# Altium footprint library IC.PcbLib: 163 footprints (part 6 of 11)
Each footprint in its own frame and in the unit in brackets; x right, y up, seen from the top. Pads: shape width x height; smd on the part's side, far side on the other; paste and mask are expansions set on the pad; w line width, h text height; cw(c..) or ccw(c..) is an arc to the next point about the centre after c.
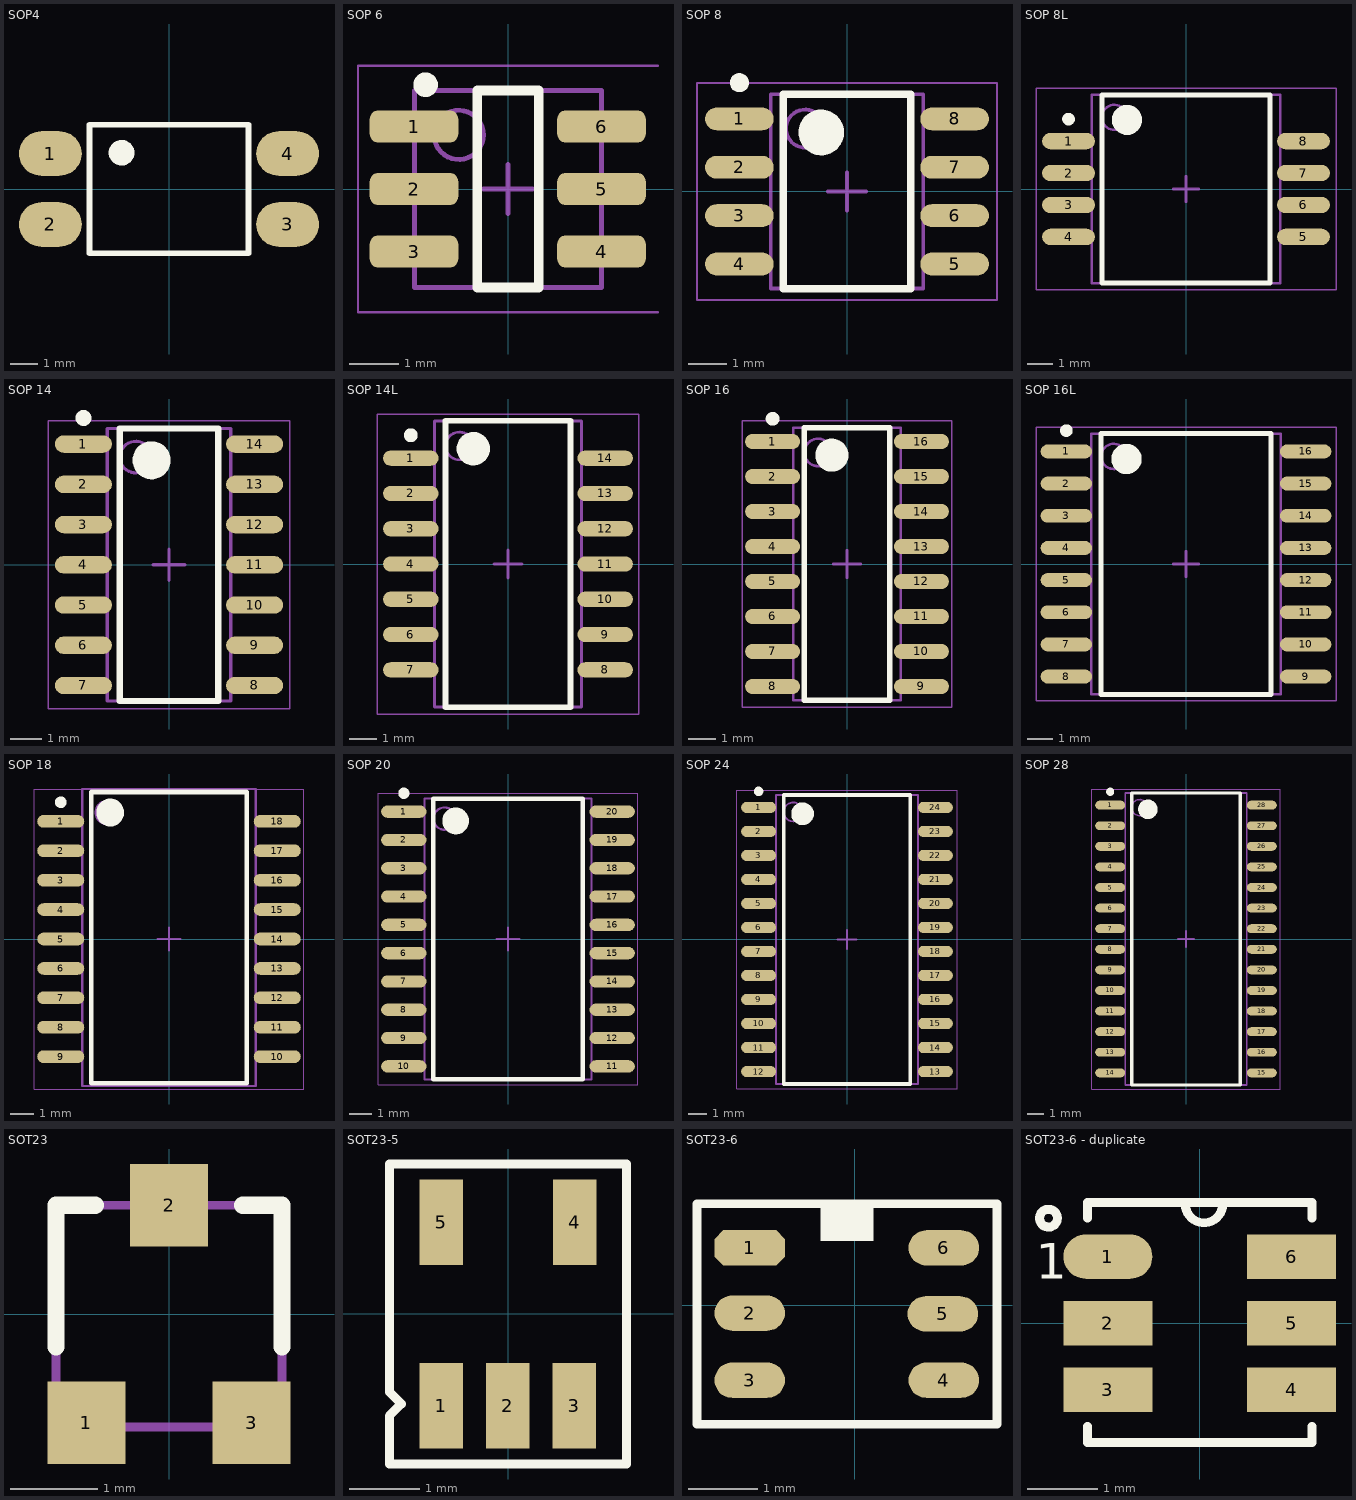
[diagram p5: the footprints below, top view; thin cyan lines are the x and y axes]

## SOP4 [mm]
pads (4):
  oval 2.25x1.6 smd: 1(-4.25,1.27) 2(-4.25,-1.27) 3(4.25,-1.27) 4(4.25,1.27)
Top Overlay:
  circle w0.2: c-1.7,1.3 r0.361
  region: -1.4,1.003 -2.006,1.003 -2.006,1.6 -1.4,1.6
  lines w0.2: -2.85,-2.3 2.85,-2.3 2.85,2.3 -2.85,2.3 -2.85,-2.3
3D body "pc817x1nip1b.stp": height 3.6, standoff 0, extent -4.673,-2.286 4.927,2.314

## SOP 6 [mm] "SOP6"
height 1.1
pads (6):
  rrect50% 1.8x0.65 smd: 1(-1.91,1.27) 2(-1.91,0) 3(-1.91,-1.27) 4(1.9,-1.27) 5(1.9,0) 6(1.9,1.27)
Top Overlay:
  circle w0.25: c-1.675,2.12 r0.125
  lines w0.2: -0.625,-2 0.625,-2 0.625,2 -0.625,2 -0.625,-2
Mechanical 13:
  circle w0.1: c-1,1.1 r0.5
  lines w0.1: -1.9,-2 1.9,-2 1.9,2 -1.9,2 -1.9,-2
Mechanical 15:
  lines w0.05: 3.048,-2.5 -3.048,-2.5 -3.048,2.5 3.048,2.5
  lines w0.1: -0.5,0 0.5,0 ; 0,-0.5 0,0.5
3D body "SOIC127P490X150-6N.step": height 1.5, standoff 0, extent -2.45,-2 2.45,2

## SOP 8 [mm] "SOIC, 8-Leads, Body 4.9x3.9mm, Pitch 1.27mm, IPC High Density"
pads (8):
  oval 1.8x0.6 smd: 1(-2.825,1.905) 2(-2.825,0.635) 3(-2.825,-0.635) 4(-2.825,-1.905) 5(2.825,-1.905) 6(2.825,-0.635) 7(2.825,0.635) 8(2.825,1.905)
Top Overlay:
  circle w0.6: c-0.675,1.55 r0.3
  circle w0.25: c-2.825,2.855 r0.125
  lines w0.2: -1.675,-2.55 1.675,-2.55 1.675,2.55 -1.675,2.55 -1.675,-2.55
Mechanical 13:
  circle w0.1: c-1.1,1.65 r0.5
  lines w0.1: -2,-2.55 2,-2.55 2,2.55 -2,2.55 -2,-2.55
Mechanical 15:
  lines w0.05: -3.937,-2.85 3.937,-2.85 3.937,2.85 -3.937,2.85 -3.937,-2.85
  lines w0.1: -0.5,0 0.5,0 ; 0,-0.5 0,0.5
3D body "CircuitWorks-SO-8 (PIC12FXXX).step": height 1.6, standoff 0, extent -2.995,-2.45 2.995,2.45

## SOP 8L [mm] "SOIC, 8-Leads, Body 7.50x7.50mm, Pitch 1.27mm, IPC Medium Density"
height 1.5
pads (8):
  oval 2.1x0.65 smd: 1(-4.675,1.905) 2(-4.675,0.635) 3(-4.675,-0.635) 4(-4.675,-1.905) 5(4.675,-1.905) 6(4.675,-0.635) 7(4.675,0.635) 8(4.675,1.905)
Top Overlay:
  circle w0.25: c-4.675,2.78 r0.125
  circle w0.6: c-2.35,2.75 r0.3
  lines w0.2: -3.35,-3.75 -3.35,3.75 3.35,3.75 3.35,-3.75 -3.35,-3.75
Mechanical 13:
  circle w0.1: c-2.85,2.85 r0.5
  lines w0.1: -3.75,-3.75 -3.75,3.75 3.75,3.75 3.75,-3.75 -3.75,-3.75
Mechanical 15:
  lines w0.05: -5.969,-4 -5.969,4 5.969,4 5.969,-4 -5.969,-4
  lines w0.1: -0.5,0 0.5,0 ; 0,-0.5 0,0.5
3D body "SOIC127P1000X150-8N.step": height 1.5, standoff 0, extent -5,-3.65 5,3.65

## SOP 14 [mm] "SOIC, 14-Leads, Body 8.60x3.90mm, Pitch 1.27mm, IPC Medium Density"
height 1.75
pads (14):
  oval 1.8x0.55 smd: 1(-2.7,3.81) 2(-2.7,2.54) 3(-2.7,1.27) 4(-2.7,0) 5(-2.7,-1.27) 6(-2.7,-2.54) 7(-2.7,-3.81) 8(2.7,-3.81) 9(2.7,-2.54) 10(2.7,-1.27) 11(2.7,0) 12(2.7,1.27) 13(2.7,2.54) 14(2.7,3.81)
Top Overlay:
  circle w0.6: c-0.55,3.3 r0.3
  circle w0.25: c-2.7,4.635 r0.125
  lines w0.2: -1.55,-4.3 1.55,-4.3 1.55,4.3 -1.55,4.3 -1.55,-4.3
Mechanical 13:
  circle w0.1: c-1.05,3.4 r0.5
  lines w0.1: -1.95,-4.3 1.95,-4.3 1.95,4.3 -1.95,4.3 -1.95,-4.3
Mechanical 15:
  lines w0.05: -3.81,-4.55 3.81,-4.55 3.81,4.55 -3.81,4.55 -3.81,-4.55
  lines w0.1: -0.5,0 0.5,0 ; 0,-0.5 0,0.5
3D body "SOIC127P600X175-14N.step": height 1.75, standoff 0, extent -2.873,-4.3 3.127,4.3

## SOP 14L [mm] "SOIC, 14-Leads, Body 10.30x5.30mm, Pitch 1.27mm, IPC Medium Density"
height 2
pads (14):
  oval 2x0.55 smd: 1(-3.5,3.81) 2(-3.5,2.54) 3(-3.5,1.27) 4(-3.5,0) 5(-3.5,-1.27) 6(-3.5,-2.54) 7(-3.5,-3.81) 8(3.5,-3.81) 9(3.5,-2.54) 10(3.5,-1.27) 11(3.5,0) 12(3.5,1.27) 13(3.5,2.54) 14(3.5,3.81)
Top Overlay:
  circle w0.25: c-3.5,4.635 r0.125
  circle w0.6: c-1.25,4.15 r0.3
  lines w0.2: -2.25,-5.15 -2.25,5.15 2.25,5.15 2.25,-5.15 -2.25,-5.15
Mechanical 13:
  circle w0.1: c-1.75,4.25 r0.5
  lines w0.1: -2.65,-5.15 -2.65,5.15 2.65,5.15 2.65,-5.15 -2.65,-5.15
Mechanical 15:
  lines w0.05: -4.699,-5.4 -4.699,5.4 4.699,5.4 4.699,-5.4 -4.699,-5.4
  lines w0.1: -0.5,0 0.5,0 ; 0,-0.5 0,0.5
3D body "SOIC127P760X150-14N.step": height 1.5, standoff 0, extent -3.81,-5.15 3.81,5.15

## SOP 16 [mm] "SOIC, 16-Leads, Body 9.90x3.91mm, Pitch 1.27mm, IPC Medium Density"
height 1.75
pads (16):
  oval 2x0.55 smd: 1(-2.7,4.445) 2(-2.7,3.175) 3(-2.7,1.905) 4(-2.7,0.635) 5(-2.7,-0.635) 6(-2.7,-1.905) 7(-2.7,-3.175) 8(-2.7,-4.445) 9(2.7,-4.445) 10(2.7,-3.175) 11(2.7,-1.905) 12(2.7,-0.635) 13(2.7,0.635) 14(2.7,1.905) 15(2.7,3.175) 16(2.7,4.445)
Top Overlay:
  circle w0.25: c-2.7,5.27 r0.125
  circle w0.6: c-0.55,3.95 r0.3
  lines w0.2: -1.55,-4.95 -1.55,4.95 1.55,4.95 1.55,-4.95 -1.55,-4.95
Mechanical 13:
  circle w0.1: c-1.05,4.05 r0.5
  lines w0.1: -1.95,-4.95 -1.95,4.95 1.95,4.95 1.95,-4.95 -1.95,-4.95
Mechanical 15:
  lines w0.05: -3.81,-5.2 -3.81,5.2 3.81,5.2 3.81,-5.2 -3.81,-5.2
  lines w0.1: -0.5,0 0.5,0 ; 0,-0.5 0,0.5
3D body "User Library-SOIC-16-1.step": height 1.4, standoff 0, extent -3,-4.95 3,4.95

## SOP 16L [mm] "SOIC, 16-Leads, Body 10.30x7.50mm, Pitch 1.27mm, IPC Medium Density"
height 2.4
pads (16):
  oval 2.032x0.55 smd: 1(-4.725,4.445) 2(-4.725,3.175) 3(-4.725,1.905) 4(-4.725,0.635) 5(-4.725,-0.635) 6(-4.725,-1.905) 7(-4.725,-3.175) 8(-4.725,-4.445) 9(4.725,-4.445) 10(4.725,-3.175) 11(4.725,-1.905) 12(4.725,-0.635) 13(4.725,0.635) 14(4.725,1.905) 15(4.725,3.175) 16(4.725,4.445)
Top Overlay:
  circle w0.25: c-4.725,5.27 r0.125
  circle w0.6: c-2.35,4.15 r0.3
  lines w0.2: -3.35,-5.15 -3.35,5.15 3.35,5.15 3.35,-5.15 -3.35,-5.15
Mechanical 13:
  circle w0.1: c-2.85,4.25 r0.5
  lines w0.1: -3.75,-5.15 -3.75,5.15 3.75,5.15 3.75,-5.15 -3.75,-5.15
Mechanical 15:
  lines w0.05: -5.925,-5.4 -5.925,5.4 5.925,5.4 5.925,-5.4 -5.925,-5.4
  lines w0.1: -0.5,0 0.5,0 ; 0,-0.5 0,0.5
3D body "User Library-SO-16W.STEP": height 2.48, standoff 0, extent -5.155,-5.165 5.155,5.165

## SOP 18 [mm] "SOIC, 18-Leads, Body 11.50x7.50mm, Pitch 1.27mm, IPC Medium Density"
height 2.3
pads (18):
  oval 2.032x0.55 smd: 1(-4.675,5.08) 2(-4.675,3.81) 3(-4.675,2.54) 4(-4.675,1.27) 5(-4.675,0) 6(-4.675,-1.27) 7(-4.675,-2.54) 8(-4.675,-3.81) 9(-4.675,-5.08) 10(4.675,-5.08) 11(4.675,-3.81) 12(4.675,-2.54) 13(4.675,-1.27) 14(4.675,0) 15(4.675,1.27) 16(4.675,2.54) 17(4.675,3.81) 18(4.675,5.08)
Top Overlay:
  circle w0.25: c-4.675,5.905 r0.125
  circle w0.6: c-2.54,5.461 r0.3
  lines w0.2: -3.35,-6.223 -3.35,6.35 3.35,6.35 3.35,-6.223 -3.35,-6.223
Mechanical 13:
  circle w0.1: c-2.667,5.461 r0.5
  lines w0.1: -3.75,-6.35 -3.75,6.477 3.75,6.477 3.75,-6.35 -3.75,-6.35
Mechanical 15:
  lines w0.05: -5.825,-6.477 -5.825,6.477 5.825,6.477 5.825,-6.477 -5.825,-6.477
  lines w0.1: -0.5,0 0.5,0 ; 0,-0.5 0,0.5
3D body "User Library-SOIC18-300.step": height 2.7, standoff 0.05, extent -5.15,-5.765 5.15,5.765

## SOP 20 [mm] "SOIC, 20-Leads, Body 12.60x7.50mm, Pitch 1.27mm, IPC Medium Density"
height 2.65
pads (20):
  oval 2.032x0.55 smd: 1(-4.675,5.715) 2(-4.675,4.445) 3(-4.675,3.175) 4(-4.675,1.905) 5(-4.675,0.635) 6(-4.675,-0.635) 7(-4.675,-1.905) 8(-4.675,-3.175) 9(-4.675,-4.445) 10(-4.675,-5.715) 11(4.675,-5.715) 12(4.675,-4.445) 13(4.675,-3.175) 14(4.675,-1.905) 15(4.675,-0.635) 16(4.675,0.635) 17(4.675,1.905) 18(4.675,3.175) 19(4.675,4.445) 20(4.675,5.715)
Top Overlay:
  circle w0.6: c-2.35,5.3 r0.3
  circle w0.25: c-4.675,6.54 r0.125
  lines w0.2: -3.35,-6.3 3.35,-6.3 3.35,6.3 -3.35,6.3 -3.35,-6.3
Mechanical 13:
  circle w0.1: c-2.85,5.4 r0.5
  lines w0.1: -3.75,-6.3 3.75,-6.3 3.75,6.3 -3.75,6.3 -3.75,-6.3
Mechanical 15:
  lines w0.05: -5.825,-6.55 5.825,-6.55 5.825,6.55 -5.825,6.55 -5.825,-6.55
  lines w0.1: -0.5,0 0.5,0 ; 0,-0.5 0,0.5
3D body "User Library-SOIC20.step": height 2.25, standoff 0.01, extent -5.067,-6.3 5.067,6.3

## SOP 24 [mm] "SOIC, 24-Leads, Body 15.30x7.50mm, Pitch 1.27mm, IPC Medium Density"
height 2.3
pads (24):
  oval 1.85x0.6 smd: 1(-4.675,6.985) 2(-4.675,5.715) 3(-4.675,4.445) 4(-4.675,3.175) 5(-4.675,1.905) 6(-4.675,0.635) 7(-4.675,-0.635) 8(-4.675,-1.905) 9(-4.675,-3.175) 10(-4.675,-4.445) 11(-4.675,-5.715) 12(-4.675,-6.985) 13(4.675,-6.985) 14(4.675,-5.715) 15(4.675,-4.445) 16(4.675,-3.175) 17(4.675,-1.905) 18(4.675,-0.635) 19(4.675,0.635) 20(4.675,1.905) 21(4.675,3.175) 22(4.675,4.445) 23(4.675,5.715) 24(4.675,6.985)
Top Overlay:
  circle w0.25: c-4.675,7.835 r0.125
  circle w0.6: c-2.35,6.65 r0.3
  lines w0.2: -3.35,-7.65 -3.35,7.65 3.35,7.65 3.35,-7.65 -3.35,-7.65
Mechanical 13:
  circle w0.1: c-2.85,6.75 r0.5
  lines w0.1: -3.75,-7.65 -3.75,7.65 3.75,7.65 3.75,-7.65 -3.75,-7.65
Mechanical 15:
  lines w0.05: -5.825,-7.9 -5.825,7.9 5.825,7.9 5.825,-7.9 -5.825,-7.9
  lines w0.1: -0.5,0 0.5,0 ; 0,-0.5 0,0.5
3D body "User Library-SOIC_24.STEP": height 2.6, standoff 0, extent -5.2,-7.835 5.2,7.565

## SOP 28 [mm] "SOIC, 28-Leads, Body 18.00x7.50mm, Pitch 1.27mm, IPC Medium Density"
height 2.3
pads (28):
  oval 1.85x0.55 smd: 1(-4.675,8.255) 2(-4.675,6.985) 3(-4.675,5.715) 4(-4.675,4.445) 5(-4.675,3.175) 6(-4.675,1.905) 7(-4.675,0.635) 8(-4.675,-0.635) 9(-4.675,-1.905) 10(-4.675,-3.175) 11(-4.675,-4.445) 12(-4.675,-5.715) 13(-4.675,-6.985) 14(-4.675,-8.255) 15(4.675,-8.255) 16(4.675,-6.985) 17(4.675,-5.715) 18(4.675,-4.445) 19(4.675,-3.175) 20(4.675,-1.905) 21(4.675,-0.635) 22(4.675,0.635) 23(4.675,1.905) 24(4.675,3.175) 25(4.675,4.445) 26(4.675,5.715) 27(4.675,6.985) 28(4.675,8.255)
Top Overlay:
  circle w0.25: c-4.675,9.08 r0.125
  circle w0.6: c-2.35,8 r0.3
  lines w0.2: -3.35,-9 -3.35,9 3.35,9 3.35,-9 -3.35,-9
Mechanical 13:
  circle w0.1: c-2.85,8.1 r0.5
  lines w0.1: -3.75,-9 -3.75,9 3.75,9 3.75,-9 -3.75,-9
Mechanical 15:
  lines w0.05: -5.825,-9.25 -5.825,9.25 5.825,9.25 5.825,-9.25 -5.825,-9.25
  lines w0.1: -0.5,0 0.5,0 ; 0,-0.5 0,0.5
3D body "User Library-28-SOIC.step": height 2.73, standoff -0.03, extent -5.023,-9.01 5.277,8.89

## SOT23 [mm] "SOT23"
height 1.1
pads (3):
  rect 0.9x0.95 smd: 1(-0.95,-1.25) 2(0,1.25)
  rect 0.9x0.95 smd mask+0: 3(0.95,-1.25)
Top Overlay:
  lines w0.2: -1.3,-0.375 -1.3,1.25 -0.85,1.25 ; 0.85,1.25 1.3,1.25 1.3,-0.375
Mechanical 7:
  rectangle: -0.3,1.25 0.3,1.5
  region: -0.625,-1.275 -1.225,-1.275 -1.225,-1.525 -0.625,-1.525
  region: 1.225,-1.275 0.625,-1.275 0.625,-1.525 1.225,-1.525
  lines w0.1: -1.3,-1.3 -1.3,1.25 1.3,1.25 1.3,-1.3 -1.3,-1.3
  text ".Comment" at -1.2,0.325 h0.5
  text ".Designator" at -1.2,0.75 h0.5
3D body "SW3DPS-SOT-23-DEFAULT.STEP": height 1.06, standoff -0.04, extent -1.524,-1.23 1.476,1.27

## SOT23-5 [mm] "CASE: SOT"
height 1.1
pads (5):
  rect 0.62x1.22 smd mask+0.076: 1(-0.953,-1.31) 2(-0.003,-1.31) 3(0.947,-1.31) 4(0.952,1.31) 5(-0.953,1.31)
Top Overlay:
  lines w0.127: -1.689,-2.138 -1.689,-1.452 -1.519,-1.281 -1.689,-1.111 -1.689,2.137 1.689,2.137 1.689,-2.138 -1.689,-2.138
3D body "User Library-SOT-23-5.STEP": height 1.41, standoff -0.05, extent -1.5,-1.5 1.5,1.5

## SOT23-6 [mil]
pads (6):
  oct 40x20 smd: 1(-59.41,32.4)
  oval 40x20 smd: 2(-59.41,-4.6) 3(-59.41,-42.6) 4(50.59,-42.6) 5(50,-5) 6(50.59,32.4)
Top Overlay:
  rectangle: -19.41,36.34 10.59,56.02
  lines w5: -89.29,43.42 -89.29,44.42 ; -89.29,47.42 -89.29,57.42 ; -75.29,57.42 -73.29,57.42 ; -74.29,57.42 -89.29,57.42 ; -89.29,57.42 -89.29,-67.58 80.71,-67.58 80.71,57.42 -89.29,57.42
3D body "User Library-SOT23-6.step": height 51.18, standoff 0, extent -64.05,-64.05 54.06,54.06

## SOT23-6 - duplicate [mm] "CASE: SOT"
height 1.45
pads (6):
  oval 1.27x0.635 smd mask+0.076: 1(-1.31,0.95)
  rect 1.27x0.635 smd mask+0.076: 2(-1.31,0) 3(-1.31,-0.95) 4(1.31,-0.95) 5(1.31,0) 6(1.31,0.95)
Top Overlay:
  circle w0.127: c-2.159,1.499 r0.127
  lines w0.127: -1.6,-1.473 -1.6,-1.704 1.6,-1.704 1.6,-1.473 ; -1.6,1.499 -1.6,1.725 1.6,1.725 1.6,1.499 ; -0.206,1.7 ccw(c0.061,1.7) 0.328,1.7
  text "1" at -2.337,0.635 h0.51
3D body "User Library-SOT-23-6-1.STEP": height 1.41, standoff -0.05, extent -1.5,-1.5 1.5,1.5